# Altium footprint library Connector.PcbLib: 129 footprints (part 9 of 9)
Each footprint in its own frame and in the unit in brackets; x right, y up, seen from the top. Pads: shape width x height; smd on the part's side, far side on the other; paste and mask are expansions set on the pad; w line width, h text height; cw(c..) or ccw(c..) is an arc to the next point about the centre after c.
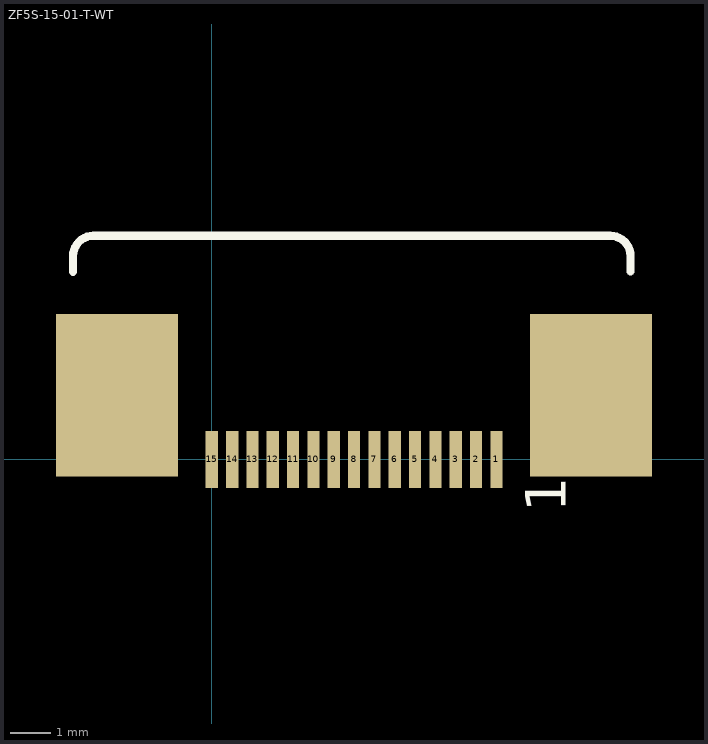
[diagram p8: the footprint, top view; thin cyan lines are the x and y axes]

## ZF5S-15-01-T-WT [mm]
pads (17):
  rect 0.3x1.4 smd: 1(7,0) 2(6.5,0) 3(6,0) 4(5.5,0) 5(5,0) 6(4.5,0) 7(4,0) 8(3.5,0) 9(3,0) 10(2.5,0) 11(2,0) 12(1.5,0) 13(1,0) 14(0.5,0) 15(0,0)
  rect 3x4 smd: ""(-2.33,1.58) ""(9.324,1.58)
Top Overlay:
  lines w0.2: -3.414,4.614 -3.414,5 cw(c-2.914,5) -2.914,5.5 9.8,5.5 cw(c9.8,5) 10.3,5 10.3,4.625
  text "1" at 8.7,-1.3 h1
3D body "ZF5S-15-01-T-WT.STEP": height 2.08, standoff -0.02, extent -3.076,-0.384 10.074,5.286